# Altium footprint library Standard.PcbLib: 139 footprints (part 9 of 9)
Each footprint in its own frame and in the unit in brackets; x right, y up, seen from the top. Pads: shape width x height; smd on the part's side, far side on the other; paste and mask are expansions set on the pad; w line width, h text height; cw(c..) or ccw(c..) is an arc to the next point about the centre after c.
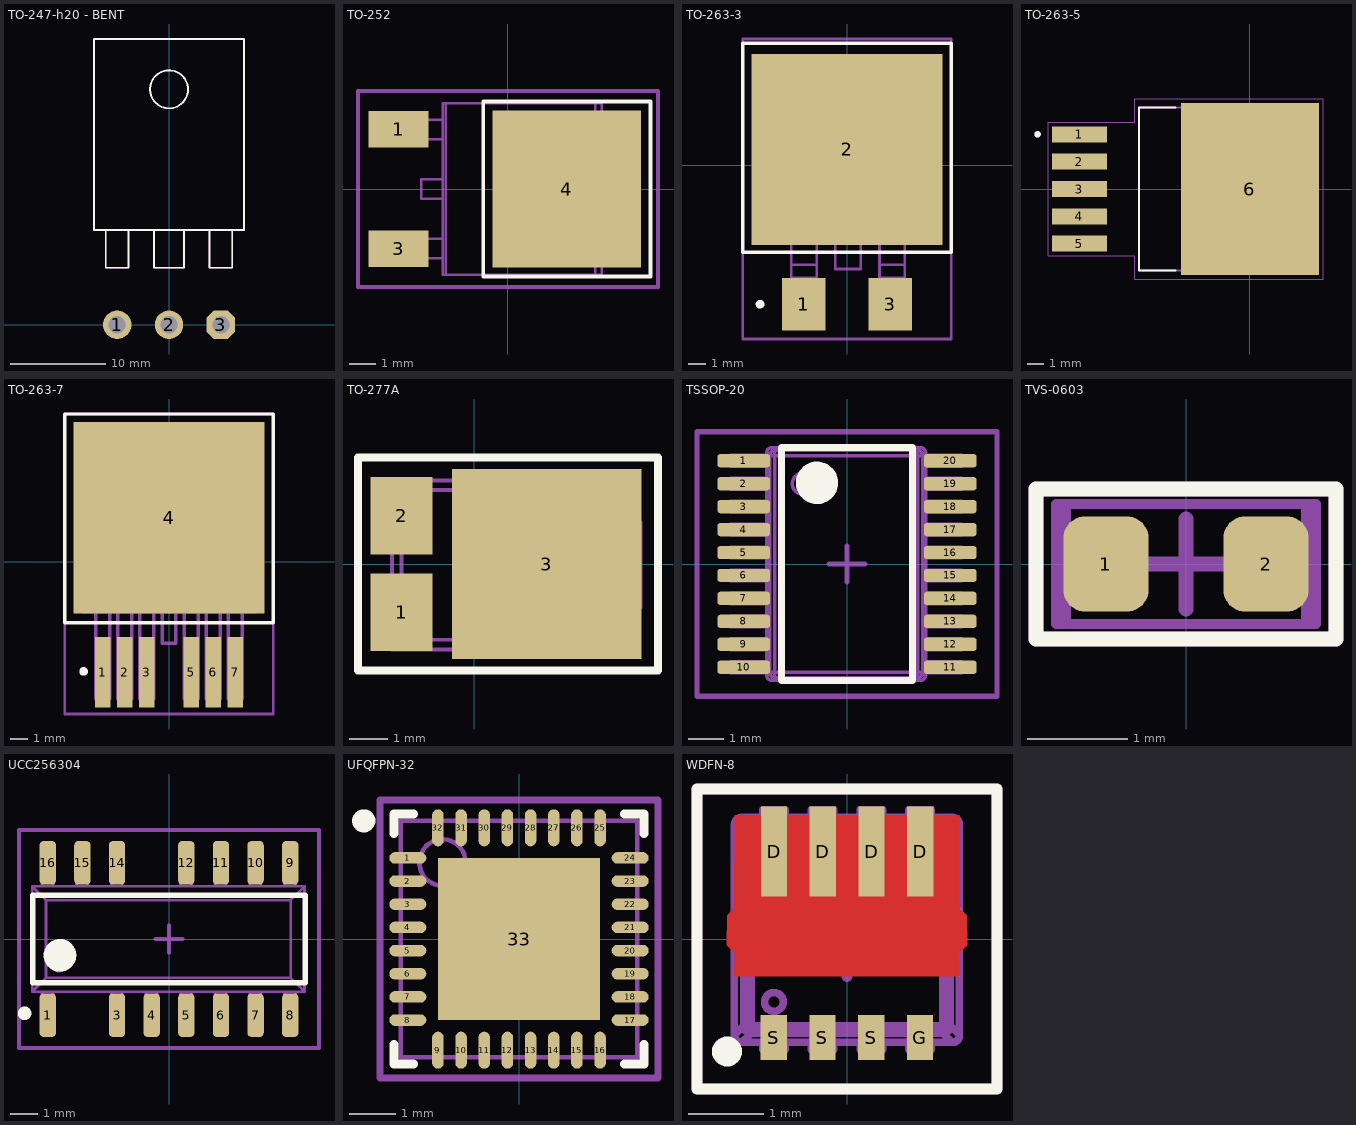
[diagram p8: the footprints below, top view; thin cyan lines are the x and y axes]

## TO-247-h20 - BENT [mm]
pads (3):
  round 3 hole 1.8: 1(-5.46,0) 2(0,0)
  oct 3x3 hole 1.8: 3(5.46,0)
Top Overlay:
  circle w0.2: c0,24.8 r2
  lines w0.2: -6.66,10 -6.66,6 -4.26,6 -4.26,10 ; -1.6,10 -1.6,6 1.6,6 1.6,10 ; 3.02,10 3.22,10 ; 4.26,10 4.26,6 6.66,6 6.66,10 ; -7.9,10 7.9,10 7.9,30.1 -7.9,30.1 -7.9,10
Top Assembly:
  circle w0.1: c0,24.8 r2
  lines w0.1: -6.66,10 -6.66,6 -4.26,6 -4.26,10 ; -1.6,10 -1.6,6 1.6,6 1.6,10 ; 4.26,10 4.26,6 6.66,6 6.66,10 ; -7.9,10 7.9,10 7.9,30.1 -7.9,30.1 -7.9,10
3D body "TO-247_horizontal_line.stp": height 5, standoff -3, extent -7.8,-0.5 7.8,30.1

## TO-252 [mm] "D-PAK, 3-Pads, Body 6,20x6,71mm (max), IPC Medium Density"
height 2.3
pads (3):
  rect 2.3x1.4 smd: 1(-4.191,2.286) 3(-4.191,-2.286)
  rect 5.7x6 smd: 4(2.25,0)
Top Overlay:
  lines w0.15: -0.95,-3.35 -0.95,3.35 5.461,3.35 5.461,-3.35 -0.95,-3.35
Top Assembly:
  lines w0.1: -4.3,-2.66 -4.1,-2.66 ; -4.3,-2.66 -4.9,-2.66 -4.9,-1.91 -4.3,-1.91 ; -4.3,-2.66 -4.3,-1.91 ; -4.3,-1.91 -4.1,-1.91 ; -4.3,1.91 -4.1,1.91 ; -4.3,1.91 -4.9,1.91 -4.9,2.66 -4.3,2.66 ; -4.3,1.91 -4.3,2.66 ; -4.3,2.66 -4.1,2.66 ; -4.1,-2.66 -4.1,-1.91 ; -4.1,-2.66 -3.45,-2.66 ; -4.1,-1.91 -3.45,-1.91 ; -4.1,1.91 -4.1,2.66 ; -4.1,1.91 -3.45,1.91 ; -4.1,2.66 -3.45,2.66 ; -3.45,-2.66 -2.5,-2.66 ; -3.45,-2.66 -3.45,-1.91 ; -3.45,-1.91 -2.5,-1.91 ; -3.45,1.91 -2.5,1.91 ; -3.45,1.91 -3.45,2.66 ; -3.45,2.66 -2.5,2.66 ; -2.5,-2.66 -2.5,-3.29 -2.39,-3.29 ; -2.5,-2.66 -2.5,-1.91 ; -2.5,-1.91 -2.5,-0.375 ; -2.5,-0.375 -2.5,0.375 ; -2.5,-0.375 -3.33,-0.375 -3.33,0.375 -2.5,0.375 ; -2.5,0.375 -2.5,1.91 ; -2.5,1.91 -2.5,2.66 ; -2.5,2.66 -2.5,3.29 -2.39,3.29 ; -2.39,-3.29 -2.39,3.29 ; -2.39,-3.29 3.35,-3.29 ; -2.39,3.29 3.35,3.29 ; 3.35,-3.29 3.6,-3.29 3.6,-2.68 ; 3.35,-3.29 3.35,3.29 ; 3.35,3.29 3.6,3.29 3.6,2.68 ; 3.6,-2.68 3.6,-1.675 ; 3.6,-2.68 4.8,-2.68 4.8,-1.93 4.3,-1.93 4.3,1.93 4.8,1.93 4.8,2.68 3.6,2.68 ; 3.6,-1.675 ccw(c3.55,-1.43) 3.8,-1.43 3.8,1.43 ccw(c3.55,1.43) 3.6,1.675 ; 3.6,-1.675 3.6,1.675 ; 3.6,1.675 3.6,2.68
Top Component Outline:
  lines w0.15: -0.5,0 0.5,0 ; 0,-0.5 0,0.5 ; -5.75,-3.75 -5.75,3.75 5.75,3.75 5.75,-3.75 -5.75,-3.75
3D body "TO-252.STEP": height 2.35, standoff 0, extent -5.06,-3.29 5.08,3.29

## TO-263-3 [mm]
pads (3):
  rect 2.5x3 smd: 1(-2.5,-8) 3(2.5,-8)
  rect 11x11 smd: 2(0,0.9)
Top Overlay:
  circle w0.25: c-5,-8 r0.125
  lines w0.2: -6,-5 -6,7 6,7 6,-5 -6,-5
Top Assembly:
  lines w0.15: -3.209,-4.263 -5.019,-4.263 ; -1.749,-4.263 -0.669,-4.263 ; 0.791,-4.263 1.871,-4.263 ; 3.331,-4.263 5.141,-4.263 ; -5.019,-4.263 -4.705,-3.949 ; -5.019,-4.263 -5.019,4.752 ; -5.019,4.752 -4.705,4.438 ; -5.019,4.752 -4.888,4.882 ; -4.888,4.882 5.011,4.882 ; -4.888,4.882 -4.888,5.226 -3.388,6.092 3.511,6.092 5.011,5.226 5.011,4.882 ; -4.705,-3.949 -4.705,4.438 ; -4.705,-3.949 4.827,-3.949 ; -4.705,4.438 4.827,4.438 ; -3.209,-6.49 -3.209,-5.729 ; -3.209,-6.49 -3.209,-6.806 -2.854,-6.806 -2.854,-7.122 ; -3.209,-6.49 -1.749,-6.49 ; -3.209,-5.729 -3.209,-4.193 -1.749,-4.193 -1.749,-5.729 ; -3.209,-5.729 -1.749,-5.729 ; -2.854,-9.135 -2.104,-9.135 ; -2.854,-9.135 -2.854,-7.395 ; -2.854,-9.135 -2.854,-9.172 -2.104,-9.172 -2.104,-9.135 ; -2.854,-7.395 -2.854,-7.122 ; -2.854,-7.395 -2.104,-7.395 ; -2.854,-7.122 -2.104,-7.122 ; -2.104,-9.135 -2.104,-7.395 ; -2.104,-7.395 -2.104,-7.122 ; -2.104,-7.122 -2.104,-6.806 -1.749,-6.806 -1.749,-6.49 ; -1.749,-6.49 -1.749,-5.729 ; 1.871,-6.49 1.871,-5.729 ; 1.871,-6.49 1.871,-6.806 2.226,-6.806 2.226,-7.122 ; 1.871,-6.49 3.331,-6.49 ; 1.871,-5.729 1.871,-4.193 3.331,-4.193 3.331,-5.729 ; 1.871,-5.729 3.331,-5.729 ; 2.226,-9.135 2.976,-9.135 ; 2.226,-9.135 2.226,-7.395 ; 2.226,-9.135 2.226,-9.172 2.976,-9.172 2.976,-9.135 ; 2.226,-7.395 2.226,-7.122 ; 2.226,-7.395 2.976,-7.395 ; 2.226,-7.122 2.976,-7.122 ; 2.976,-9.135 2.976,-7.395 ; 2.976,-7.395 2.976,-7.122 ; 2.976,-7.122 2.976,-6.806 3.331,-6.806 3.331,-6.49 ; 3.331,-6.49 3.331,-5.729 ; 4.827,-3.949 5.141,-4.263 ; 4.827,-3.949 4.827,4.438 ; 4.827,4.438 5.141,4.752 ; 5.011,4.882 5.141,4.752 ; 5.141,-4.263 5.141,4.752 ; -0.669,-5.973 0.791,-5.973 0.791,-4.193 -0.669,-4.193 -0.669,-5.973
Top Component Outline:
  lines w0.15: -6,-10 6,-10 6,7.25 -6,7.25 -6,-10
3D body "User Library-DPAK (1).step": height 4.98, standoff -0.03, extent -5.08,-9.25 5.08,6.014

## TO-263-5 [mm]
pads (6):
  rect 3.4x1 smd paste-3 mask+0: 1(-10.6,3.4) 2(-10.6,1.7) 3(-10.6,0) 4(-10.6,-1.7) 5(-10.6,-3.4)
  rect 8.6x10.7 smd paste-6 mask+0: 6(0,0)
Top Overlay:
  circle w0.2: c-13.2,3.4 r0.1
  lines w0.127: -4.62,-5.08 -6.905,-5.08 -6.905,5.08 -4.62,5.08
Top Paste:
  region: -8.95,-3.85 -12.25,-3.85 -12.25,-2.95 -8.95,-2.95
  region: -8.95,-2.15 -12.25,-2.15 -12.25,-1.25 -8.95,-1.25
  region: -8.95,2.95 -12.25,2.95 -12.25,3.85 -8.95,3.85
  region: -8.95,1.25 -12.25,1.25 -12.25,2.15 -8.95,2.15
  region: -8.95,-0.45 -12.25,-0.45 -12.25,0.45 -8.95,0.45
  region: 4.25,-5.3 -4.25,-5.3 -4.25,5.3 4.25,5.3
Top Solder:
  region: -8.83,-3.97 -12.37,-3.97 -12.37,-2.83 -8.83,-2.83
  region: -8.83,-2.27 -12.37,-2.27 -12.37,-1.13 -8.83,-1.13
  region: -8.83,2.83 -12.37,2.83 -12.37,3.97 -8.83,3.97
  region: -8.83,1.13 -12.37,1.13 -12.37,2.27 -8.83,2.27
  region: -8.83,-0.57 -12.37,-0.57 -12.37,0.57 -8.83,0.57
  region: 4.37,-5.42 -4.37,-5.42 -4.37,5.42 4.37,5.42
Top Assembly:
  circle w0.2: c-13.2,3.4 r0.1
  lines w0.127: -6.905,-5.08 2.02,-5.08 2.02,5.08 -6.905,5.08 -6.905,-5.08
Top Component Outline:
  lines w0.05: -12.55,-4.15 -12.55,4.15 -7.155,4.15 -7.155,5.6 4.55,5.6 4.55,-5.6 -7.155,-5.6 -7.155,-4.15 -12.55,-4.15
3D body "LM2596SX-ADJ.STEP": height 4.65, standoff -0.15, extent -11.5,-5.08 2.851,5.08

## TO-263-7 [mm] "D2-PAK, 7-Pads, Body 7,93x8,69mm (max), IPC Medium Density"
height 4.8
pads (7):
  rect 0.9x4.05 smd: 1(-3.81,-6.35) 2(-2.54,-6.35) 3(-1.27,-6.35) 5(1.27,-6.35) 6(2.54,-6.35) 7(3.81,-6.35)
  rect 11x11 smd: 4(0,2.54)
Top Overlay:
  circle w0.25: c-4.91,-6.3 r0.125
  lines w0.2: -6,-3.5 -6,8.5 6,8.5 6,-3.5 -6,-3.5
Top Assembly:
  drawing of 182 lines, arcs and shapes, not listed
Top Component Outline:
  lines w0.15: -0.5,0 0.5,0 ; 0,-0.5 0,0.5 ; -6,-8.75 6,-8.75 6,8.5 -6,8.5 -6,-8.75
3D body "SW3dPS-TO263-7S.STEP": height 4.88, standoff 0.08, extent -5,-7.869 5,7.801

## TO-277A [mm]
pads (3):
  rect 1.6x2 smd: 1(-1.875,-1.25) 2(-1.875,1.25)
  rect 4.9x4.9 smd: 3(1.875,0)
Top Overlay:
  lines w0.2: -3,-2.75 -3,2.75 4.75,2.75 4.75,-2.75 -3,-2.75
Top Assembly:
  lines w0.1: -2.124,-1.806 -2.375,-1.806 -2.375,-0.451 -2.124,-0.451 ; -2.124,0.402 -2.375,0.402 -2.375,1.756 -2.124,1.756 ; -0.263,-2.207 -0.263,-2.408 0.49,-2.408 0.49,-2.207 ; -0.263,2.158 -0.263,2.359 0.49,2.359 0.49,2.158 ; 4.047,-1.129 4.298,-1.129 4.298,1.079 4.047,1.079 ; -2.124,-2.207 -2.124,2.158 ; -2.124,-2.207 4.047,-2.207 ; -2.124,-2.207 -1.873,-1.957 ; -2.124,2.158 4.047,2.158 ; -2.124,2.158 -1.873,1.907 ; -1.873,-1.957 -1.873,1.907 ; -1.873,-1.957 3.797,-1.957 ; -1.873,1.907 3.797,1.907 ; 3.797,-1.957 3.797,1.907 ; 3.797,-1.957 4.047,-2.207 ; 3.797,1.907 4.047,2.158 ; 4.047,-2.207 4.047,2.158
Top Component Outline:
  lines w0.15: 0.125,0 1.125,0 ; 0.625,-0.5 0.625,0.5 ; -3,-2.75 -3,2.75 4.75,2.75 4.75,-2.75 -3,-2.75
3D body "User Library-TO-277A.step": height 1.2, standoff 0, extent -2.375,-2.375 4.275,2.375

## TSSOP-20 [mm] "SOP, 20-Leads, Body 6,50x4,40mm, Pitch 0,65mm, IPC Medium Density"
height 2.65
pads (20):
  rrect50% 1.5x0.38 smd mask+0.075: 1(-2.925,2.925) 2(-2.925,2.275) 3(-2.925,1.625) 4(-2.925,0.975) 5(-2.925,0.325) 6(-2.925,-0.325) 7(-2.925,-0.975) 8(-2.925,-1.625) 9(-2.925,-2.275) 10(-2.925,-2.925) 11(2.925,-2.925) 12(2.925,-2.275) 13(2.925,-1.625) 14(2.925,-0.975) 15(2.925,-0.325) 16(2.925,0.325) 17(2.925,0.975) 18(2.925,1.625) 19(2.925,2.275) 20(2.925,2.925)
Top Overlay:
  circle w0.6: c-0.85,2.3 r0.3
  lines w0.2: -1.85,-3.3 1.85,-3.3 1.85,3.3 -1.85,3.3 -1.85,-3.3
Top Assembly:
  drawing of 315 lines, arcs and shapes, not listed
Top Component Outline:
  lines w0.15: -0.5,0 0.5,0 ; 0,-0.5 0,0.5 ; -4.25,-3.75 4.25,-3.75 4.25,3.75 -4.25,3.75 -4.25,-3.75
3D body "User Library-TSSOP-20.step": height 1.2, standoff 0, extent -3.275,-3.3 3.275,3.3

## TVS-0603 [mm]
height 0.6
pads (2):
  rrect50% 0.85x0.95 smd: 1(-0.8,0) 2(0.8,0)
Top Overlay:
  lines w0.15: -1.5,-0.75 -1.5,0.75 0,0.75 1.5,0.75 1.5,-0.75 0,-0.75 -1.5,-0.75
Top Assembly:
  lines w0.1: -1.2,-0.6 -1.2,0.6 ; 1.2,-0.6 1.2,0.6 ; -1.3,-0.6 -1.3,0.6 1.3,0.6 1.3,-0.6 -1.3,-0.6
Top Component Outline:
  lines w0.15: -0.45,0 0.45,0 ; 0,-0.45 0,0.45 ; -1.5,-0.75 -1.5,0.75 1.5,0.75 1.5,-0.75 -1.5,-0.75
3D body "82306050029.stp": height 0.95, standoff 0.05, extent -0.8,-0.4 0.8,0.4

## UCC256304 [mm] "SOIC, 16-Leads, UCC256304"
height 1.75
pads (14):
  rrect50% 0.6x1.6 smd: 1(-4.445,-2.794) 3(-1.905,-2.794) 4(-0.635,-2.794) 5(0.635,-2.794) 6(1.905,-2.794) 7(3.175,-2.794) 8(4.445,-2.794) 9(4.445,2.794) 10(3.175,2.794) 11(1.905,2.794) 12(0.635,2.794) 14(-1.905,2.794) 15(-3.175,2.794) 16(-4.445,2.794)
Top Overlay:
  circle w0.25: c-5.295,-2.725 r0.125
  circle w0.6: c-4,-0.6 r0.3
  lines w0.2: -5,-1.6 5,-1.6 5,1.6 -5,1.6 -5,-1.6
Top Assembly:
  drawing of 243 lines, arcs and shapes, not listed
Top Component Outline:
  lines w0.15: -0.5,0 0.5,0 ; 0,-0.5 0,0.5 ; -5.5,-4 5.5,-4 5.5,4 -5.5,4 -5.5,-4
3D body "CircuitWorks-SO-16.step": height 1.45, standoff 0, extent -4.991,-2.921 4.991,2.984

## UFQFPN-32 [mm] "PQFN, 32-Leads, Body 5,00x5,00mm, Pitch 0,50mm, Thermal Pad 3,50x3,50mm, IPC Medium Density"
height 0.6
pads (33):
  oval 0.8x0.25 smd: 1(-2.4,1.75) 2(-2.4,1.25) 3(-2.4,0.75) 4(-2.4,0.25) 5(-2.4,-0.25) 6(-2.4,-0.75) 7(-2.4,-1.25) 8(-2.4,-1.75) 17(2.4,-1.75) 18(2.4,-1.25) 19(2.4,-0.75) 20(2.4,-0.25) 21(2.4,0.25) 22(2.4,0.75) 23(2.4,1.25) 24(2.4,1.75)
  oval 0.25x0.8 smd: 9(-1.75,-2.4) 10(-1.25,-2.4) 11(-0.75,-2.4) 12(-0.25,-2.4) 13(0.25,-2.4) 14(0.75,-2.4) 15(1.25,-2.4) 16(1.75,-2.4) 25(1.75,2.4) 26(1.25,2.4) 27(0.75,2.4) 28(0.25,2.4) 29(-0.25,2.4) 30(-0.75,2.4) 31(-1.25,2.4) 32(-1.75,2.4)
  rect 3.5x3.5 smd: 33(0,0)
Top Overlay:
  circle w0.25: c-3.35,2.55 r0.125
  lines w0.2: -2.7,-2.275 -2.7,-2.7 -2.275,-2.7 ; -2.7,2.275 -2.7,2.7 -2.275,2.7 ; 2.275,-2.7 2.7,-2.7 2.7,-2.275 ; 2.275,2.7 2.7,2.7 2.7,2.275
Top Assembly:
  circle w0.1: c-1.65,1.65 r0.5
  lines w0.1: -2.55,-2.55 2.55,-2.55 2.55,2.55 -2.55,2.55 -2.55,-2.55
Top Component Outline:
  lines w0.15: -0.5,0 0.5,0 ; 0,-0.5 0,0.5 ; -3,-3 3,-3 3,3 -3,3 -3,-3
3D body "User Library-QFN32-1.step": height 0.9, standoff -0.03, extent -2.501,-2.5 2.5,2.5

## WDFN-8 [mm]
pads (8):
  rect 0.35x1.2 smd: D(-0.973,1.166) D(-0.323,1.166) D(0.327,1.166) D(0.977,1.166)
  rect 0.35x0.6 smd: G(0.973,-1.316) S(-0.977,-1.316) S(-0.327,-1.316) S(0.323,-1.316)
Top Layer:
  region: -1.5,-0.5 -1.5,-0.186 -1.6,-0.086 -1.6,0.318 -1.5,0.417 -1.5,1.65 1.5,1.65 1.5,0.417 1.6,0.318 1.6,-0.086 1.5,-0.187 1.5,-0.5
Top Overlay:
  circle w0.2: c-1.6,-1.5 r0.1
  lines w0.15: -2,-2 -2,2 2,2 2,-2 -2,-2
Top Assembly:
  drawing of 483 lines, arcs and shapes, not listed
Top Component Outline:
  lines w0.15: -0.5,0 0.5,0 ; 0,-0.5 0,0.5 ; -2,-2 2,-2 2,2 -2,2 -2,-2
3D body "User Library-DFN8_3x3_0_65Pitch.step": height 0.8, standoff 0, extent -1.552,-1.465 1.548,1.735